# Altium footprint library TarabusLib_KAP.PcbLib: 504 footprints (part 12 of 32)
Each footprint in its own frame and in the unit in brackets; x right, y up, seen from the top. Pads: shape width x height; smd on the part's side, far side on the other; paste and mask are expansions set on the pad; w line width, h text height; cw(c..) or ccw(c..) is an arc to the next point about the centre after c.
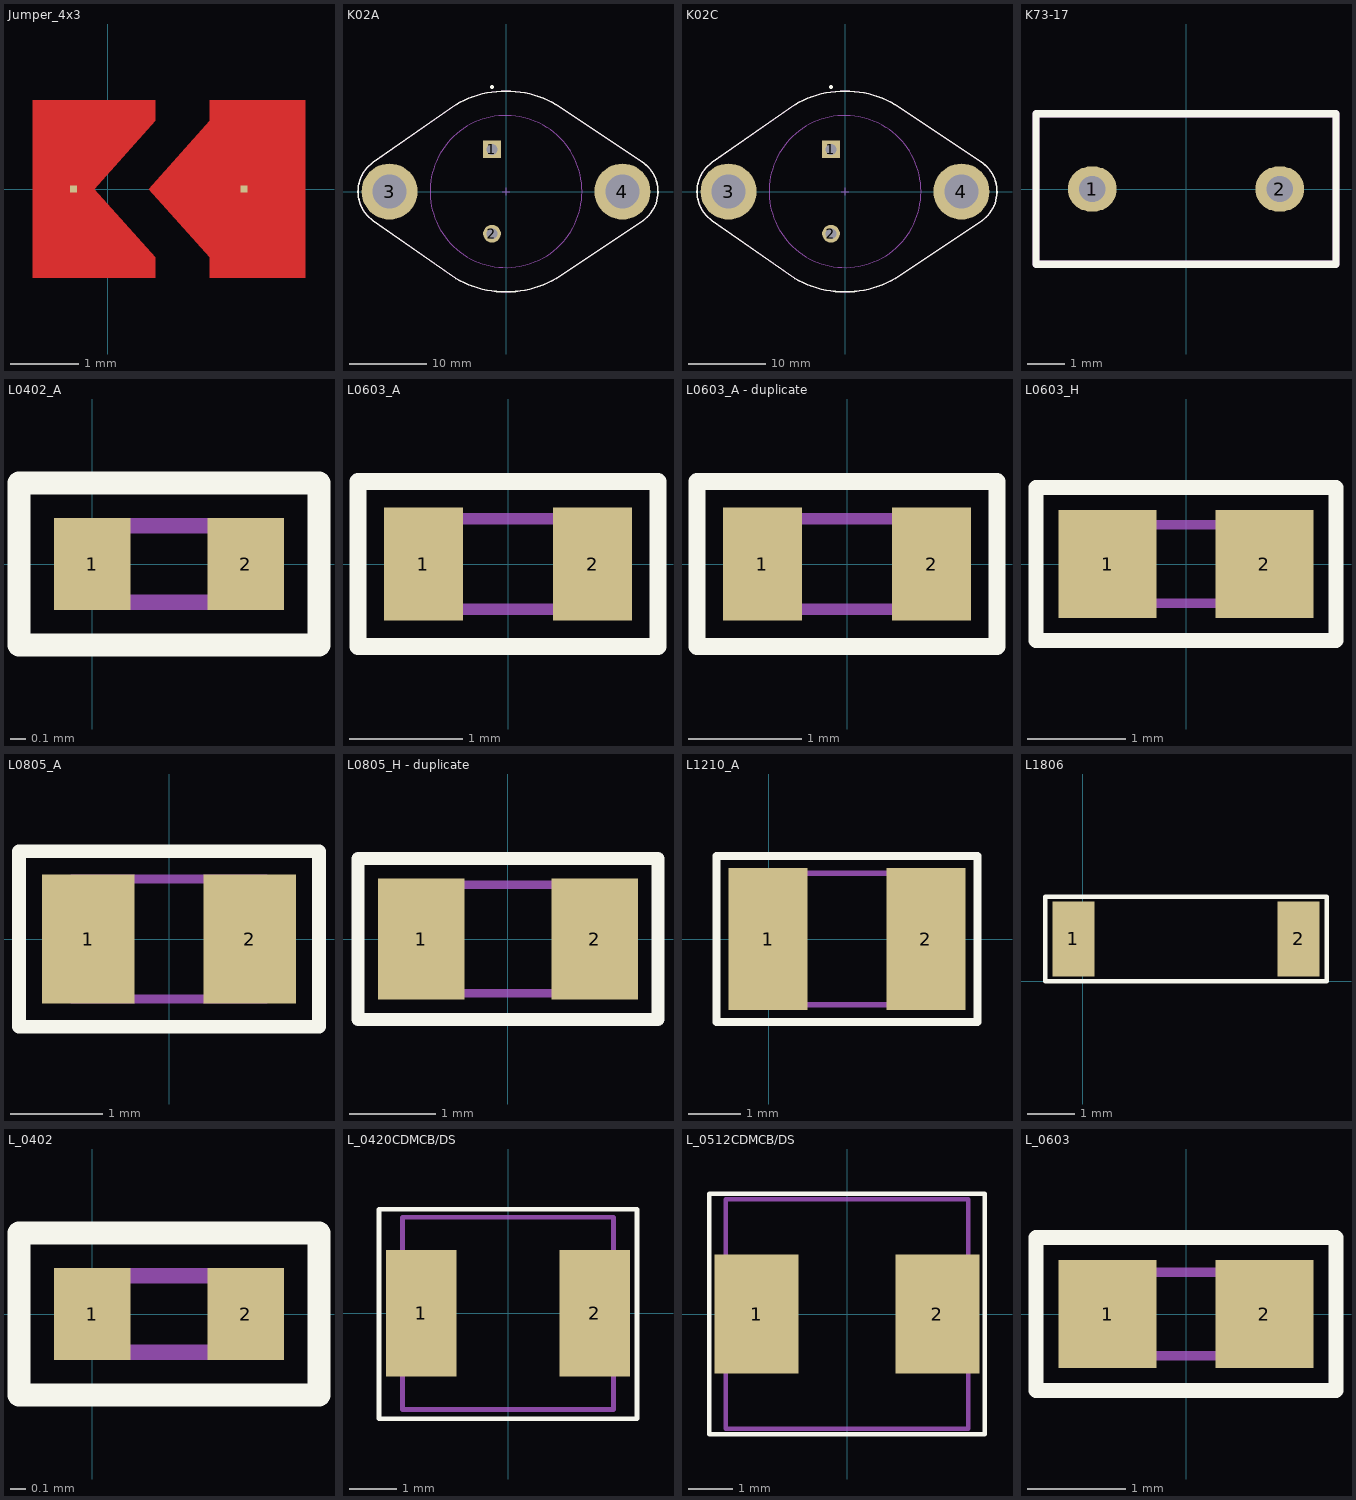
[diagram p11: the footprints below, top view; thin cyan lines are the x and y axes]

## Jumper_4x3 [mm] "4x3"
pads (2):
  rect 0.1x0.1 smd: 1(-0.5,0) 2(2,0)
Top Layer:
  region: 1.5,1.3 1.5,1 0.6,0 1.5,-1 1.5,-1.3 2.9,-1.3 2.9,1.3
  region: -1.1,1.3 -1.1,-1.3 0.7,-1.3 0.7,-1 -0.2,0 0.7,1 0.7,1.3
Top Solder:
  region: -1.3,1.5 -1.3,-1.5 3.1,-1.5 3.1,1.5

## K02A [mm] "Oval Flange Mount with (2) Offset Leads; Pin Spacing 10.93 mm; Lead Dia. 1.09 mm (max)"
height 8.94
pads (4):
  rect 2.3x2.3 hole 1.4: 1(-1.815,5.46)
  round 2.3 hole 1.4: 2(-1.815,-5.46)
  round 7.25 hole 4.4: 3(-15.075,0) 4(15.075,0)
Top Overlay:
  circle w0.25: c-1.815,13.53 r0.125
  lines w0.2: -17.2,-3.767 cw(c-14.561,0.001) -17.2,3.769 -6.5,11.258 cw(c0,0) 6.5,11.258 17.58,3.858 cw(c15.075,0) 17.713,-3.768 6.5,-11.258 cw(c0,0) -6.5,-11.258 -17.2,-3.767
Mechanical 13:
  circle w0.1: c0,0 r9.84
  lines w0.1: -17.2,-3.767 cw(c-14.561,0.001) -17.2,3.769 -6.5,11.258 cw(c0,0) 6.5,11.258 17.58,3.858 cw(c15.075,0) 17.713,-3.768 6.5,-11.258 cw(c0,0) -6.5,-11.258 -17.2,-3.767
Mechanical 15:
  lines w0.1: -0.5,0 0.5,0 ; 0,-0.5 0,0.5
3D body: height 1.77, standoff 0, extent -19.162,-13.001 19.676,13.001
3D body: height 8.94, standoff 1.77, extent -9.839,-9.839 9.839,9.839

## K02C [mm] "Oval Flange Mount with (2) Offset Leads; Pin Spacing 10.93 mm; Lead Dia. 1.09 mm (max)"
height 7.74
pads (4):
  rect 2.3x2.3 hole 1.4: 1(-1.815,5.46)
  round 2.3 hole 1.4: 2(-1.815,-5.46)
  round 7.25 hole 4.4: 3(-15.075,0) 4(15.075,0)
Top Overlay:
  circle w0.25: c-1.815,13.53 r0.125
  lines w0.2: -17.2,-3.767 cw(c-14.561,0.001) -17.2,3.769 -6.5,11.258 cw(c0,0) 6.5,11.258 17.58,3.858 cw(c15.075,0) 17.713,-3.768 6.5,-11.258 cw(c0,0) -6.5,-11.258 -17.2,-3.767
Mechanical 13:
  circle w0.1: c0,0 r9.84
  lines w0.1: -17.2,-3.767 cw(c-14.561,0.001) -17.2,3.769 -6.5,11.258 cw(c0,0) 6.5,11.258 17.58,3.858 cw(c15.075,0) 17.713,-3.768 6.5,-11.258 cw(c0,0) -6.5,-11.258 -17.2,-3.767
Mechanical 15:
  lines w0.1: -0.5,0 0.5,0 ; 0,-0.5 0,0.5
3D body: height 1.77, standoff 0, extent -19.162,-13.001 19.676,13.001
3D body: height 7.74, standoff 1.77, extent -9.839,-9.839 9.839,9.839

## K73-17 [mm]
pads (2):
  oval 1.3x1.2 hole 0.7: 1(-2.5,0) 2(2.5,0)
Top Overlay:
  lines w0.2: -4,-2 -4,2 4,2 4,-2 -4,-2
Mechanical 7:
  lines w0.2: -4,-2 4,-2 4,2 -4,2 -4,-2
Mechanical 10:
  text ".Designator" at 0.4,2.4 h0.8
  text ".Comment" at 1,-3 h0.6

## L0402_A [mm]
pads (2):
  rect 0.5x0.6 smd: 1(0,0) 2(1,0)
Top Overlay:
  lines w0.15: -0.48,-0.53 1.48,-0.53 1.48,0.53 -0.48,0.53 -0.48,-0.53
Mechanical 7:
  lines w0.1: 0,-0.25 0,0.25 1,0.25 1,-0.25 0,-0.25
Mechanical 10:
  text ".Comment" at -0.08,-1.11 h0.6
  text ".Designator" at -0.08,0.75 h0.8
3D body: height 0.35, standoff 0, extent 0,-0.25 1,0.25

## L0603_A [mm]
height 0.8
pads (2):
  rect 0.7x1 smd: 1(-0.75,0) 2(0.75,0)
Top Overlay:
  lines w0.15: -1.33,-0.73 -1.33,0.73 1.33,0.73 1.33,-0.73 -1.33,-0.73
Mechanical 7:
  lines w0.1: -0.8,-0.4 0.8,-0.4 0.8,0.4 -0.8,0.4 -0.8,-0.4
Mechanical 10:
  text ".Comment" at -0.75,-1.28 h0.6
  text ".Designator" at -0.62,1 h0.8
3D body: height 0.8, standoff 0, extent -0.8,-0.4 0.8,0.4

## L0603_A - duplicate [mm]
height 0.8
pads (2):
  rect 0.7x1 smd: 1(-0.75,0) 2(0.75,0)
Top Overlay:
  lines w0.15: -1.33,-0.73 -1.33,0.73 1.33,0.73 1.33,-0.73 -1.33,-0.73
Mechanical 7:
  lines w0.1: -0.8,-0.4 0.8,-0.4 0.8,0.4 -0.8,0.4 -0.8,-0.4
Mechanical 10:
  text ".Comment" at -0.75,-1.28 h0.6
  text ".Designator" at -0.62,1 h0.8
3D body: height 0.8, standoff 0, extent -0.8,-0.4 0.8,0.4

## L0603_H [mm]
height 0.8
pads (2):
  rect 1x1.1 smd: 1(-0.8,0) 2(0.8,0)
Top Overlay:
  lines w0.15: -1.53,-0.78 -1.53,0.78 1.53,0.78 1.53,-0.78 -1.53,-0.78
Mechanical 7:
  lines w0.1: -0.8,-0.4 0.8,-0.4 0.8,0.4 -0.8,0.4 -0.8,-0.4
Mechanical 10:
  text ".Designator" at -0.62,1 h0.8
  text ".Comment" at -0.61,-1.33 h0.6
3D body: height 0.8, standoff 0, extent -0.8,-0.4 0.8,0.4

## L0805_A [mm]
height 1.4
pads (2):
  rect 1x1.4 smd: 1(-0.875,0) 2(0.875,0)
Top Overlay:
  lines w0.15: -1.625,-0.95 1.625,-0.95 1.625,0.95 -1.625,0.95 -1.625,-0.95
Mechanical 7:
  lines w0.1: -1.05,-0.65 1.05,-0.65 1.05,0.65 -1.05,0.65 -1.05,-0.65
Mechanical 10:
  text ".Comment" at -1.125,-1.625 h0.6
  text ".Designator" at -1.525,1.375 h0.8
3D body: height 1.4, standoff 0, extent -1.05,-0.65 1.05,0.65

## L0805_H - duplicate [mm]
pads (2):
  rect 1x1.4 smd: 1(-1,0) 2(1,0)
Top Overlay:
  lines w0.15: -1.73,-0.93 -1.73,0.93 1.73,0.93 1.73,-0.93 -1.73,-0.93
Mechanical 7:
  lines w0.1: -1,-0.625 1,-0.625 1,0.625 -1,0.625 -1,-0.625
Mechanical 10:
  text ".Designator" at -1.25,1.275 h0.8
  text ".Comment" at -0.59,-1.6 h0.6
3D body: height 1.3, standoff 0, extent -1,-0.625 1,0.625

## L1210_A [mm]
pads (2):
  rect 1.5x2.7 smd: 1(-0.01,0) 2(2.99,0)
Top Overlay:
  lines w0.15: -0.99,-1.58 3.97,-1.58 3.97,1.58 -0.99,1.58 -0.99,-1.58
Mechanical 7:
  lines w0.1: -0.11,-1.25 -0.11,1.25 3.09,1.25 3.09,-1.25 -0.11,-1.25
Mechanical 10:
  text ".Comment" at 0.75,-2.23 h0.6
  text ".Designator" at 0.78,1.89 h0.8
3D body: height 2.5, standoff 0, extent -0.11,-1.25 3.09,1.25

## L1806 [mm] "Ферритова бусина"
height 1.6
pads (2):
  rect 0.9x1.6 smd: 1(-0.2,0.9) 2(4.6,0.9)
Top Overlay:
  lines w0.1: -0.8,0 -0.8,1.8 5.2,1.8 5.2,0 -0.8,0
3D body: height 1.6, standoff 0, extent -0.1,0.1 4.5,1.7

## L_0402 [mm]
pads (2):
  rect 0.5x0.6 smd: 1(0,0) 2(1,0)
Top Overlay:
  lines w0.15: -0.48,-0.53 1.48,-0.53 1.48,0.53 -0.48,0.53 -0.48,-0.53
Mechanical 7:
  lines w0.1: 0,-0.25 0,0.25 1,0.25 1,-0.25 0,-0.25
Mechanical 10:
  text ".Comment" at -0.08,-1.11 h0.6
  text ".Designator" at -0.08,0.75 h0.8
3D body: height 0.35, standoff 0, extent 0,-0.25 1,0.25

## L_0420CDMCB/DS [mm] "SMD Power Inductor SUMIDA"
height 1.2
pads (2):
  rect 1.5x2.7 smd mask+0: 1(-1.85,0) 2(1.85,0)
Top Overlay:
  lines w0.1: -2.75,-2.25 -2.75,2.225 2.75,2.225 2.75,-2.25 -2.75,-2.25
Mechanical 7:
  lines w0.1: -2.25,-2.05 2.25,-2.05 2.25,2.05 -2.25,2.05 -2.25,-2.05
Mechanical 10:
  text ".Comment" at -1.15,-2.8 h0.6
  text ".Designator" at -1.8,2.5 h0.8
3D body: height 1.2, standoff 0.05, extent -2.25,-2.05 2.25,2.05

## L_0512CDMCB/DS [mm] "SMD Power Inductor SUMIDA"
height 1.2
pads (2):
  rect 1.9x2.7 smd mask+0: 1(-2.05,0) 2(2.05,0)
Top Overlay:
  lines w0.1: -3.125,-2.725 3.125,-2.725 3.125,2.725 -3.125,2.725 -3.125,-2.725
Mechanical 7:
  lines w0.1: -2.75,-2.6 -2.75,2.6 2.75,2.6 2.75,-2.6 -2.75,-2.6
Mechanical 10:
  text ".Designator" at -1.775,3 h0.8
  text ".Comment" at -1.1,-3.275 h0.6
3D body: height 1.2, standoff 0.05, extent -2.75,-2.6 2.75,2.6

## L_0603 [mm]
height 0.45
pads (2):
  rect 1x1.1 smd: 1(-0.8,0) 2(0.8,0)
Top Overlay:
  lines w0.15: -1.53,-0.78 -1.53,0.78 1.53,0.78 1.53,-0.78 -1.53,-0.78
Mechanical 7:
  lines w0.1: -0.8,-0.425 0.8,-0.425 0.8,0.425 -0.8,0.425 -0.8,-0.425
Mechanical 10:
  text ".Designator" at -0.62,1 h0.8
  text ".Comment" at -0.78,-1.36 h0.6
3D body: height 0.45, standoff 0, extent -0.8,-0.425 0.8,0.425